# Altium footprint library CRD25DA12N-FMC.PcbLib: 142 footprints (part 9 of 9)
Each footprint in its own frame and in the unit in brackets; x right, y up, seen from the top. Pads: shape width x height; smd on the part's side, far side on the other; paste and mask are expansions set on the pad; w line width, h text height; cw(c..) or ccw(c..) is an arc to the next point about the centre after c.
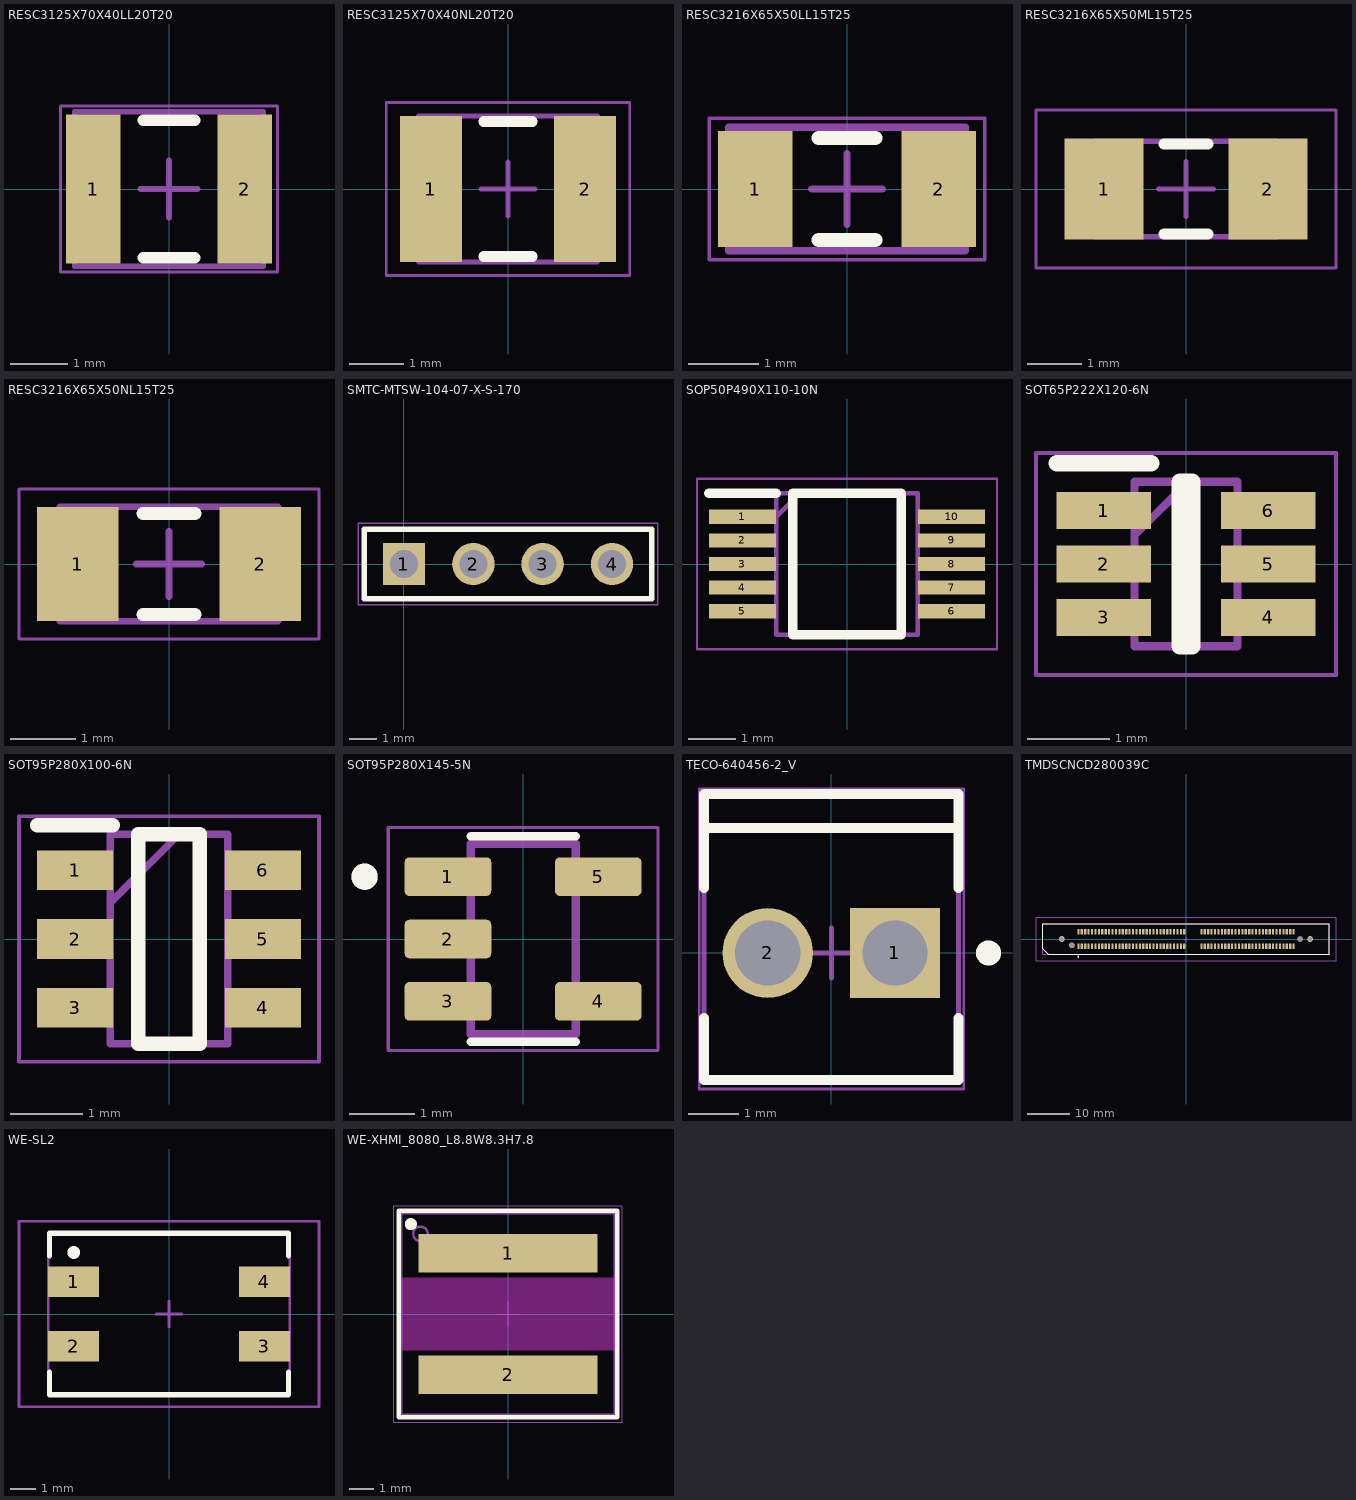
[diagram p8: the footprints below, top view; thin cyan lines are the x and y axes]

## RESC3125X70X40LL20T20 [mm] "Chip Resistor, 2-Leads, Body 3.10x2.50mm, IPC High Density"
height 0.7
pads (2):
  rect 0.95x2.6 smd: 1(-1.325,0) 2(1.325,0)
Top Overlay:
  lines w0.2: -0.45,-1.2 0.45,-1.2 ; -0.45,1.2 0.45,1.2
Mechanical 13:
  lines w0.1: -1.65,-1.35 1.65,-1.35 1.65,1.35 -1.65,1.35 -1.65,-1.35
Mechanical 15:
  lines w0.05: -1.9,-1.45 1.9,-1.45 1.9,1.45 -1.9,1.45 -1.9,-1.45
  lines w0.1: -0.5,0 0.5,0 ; 0,-0.5 0,0.5
3D body: height 0.7, standoff 0, extent 1.25,-1.35 1.65,1.35
3D body: height 0.7, standoff 0, extent -1.65,-1.35 -1.25,1.35
3D body: height 0.7, standoff 0, extent -1.25,-1.35 1.25,1.35

## RESC3125X70X40NL20T20 [mm] "Chip Resistor, 2-Leads, Body 3.10x2.50mm, IPC Medium Density"
height 0.7
pads (2):
  rect 1.15x2.7 smd: 1(-1.425,0) 2(1.425,0)
Top Overlay:
  lines w0.2: -0.45,-1.25 0.45,-1.25 ; -0.45,1.25 0.45,1.25
Mechanical 13:
  lines w0.1: -1.65,-1.35 -1.65,1.35 1.65,1.35 1.65,-1.35 -1.65,-1.35
Mechanical 15:
  lines w0.05: -2.25,-1.6 -2.25,1.6 2.25,1.6 2.25,-1.6 -2.25,-1.6
  lines w0.1: -0.5,0 0.5,0 ; 0,-0.5 0,0.5
3D body: height 0.7, standoff 0, extent -1.25,-1.35 1.25,1.35
3D body: height 0.7, standoff 0, extent -1.65,-1.35 -1.25,1.35
3D body: height 0.7, standoff 0, extent 1.25,-1.35 1.65,1.35

## RESC3216X65X50LL15T25 [mm] "Chip Resistor, 2-Leads, Body 3.20x1.60mm, IPC High Density"
height 0.65
pads (2):
  rect 1.05x1.65 smd: 1(-1.3,0) 2(1.3,0)
Top Overlay:
  lines w0.2: -0.4,-0.725 0.4,-0.725 ; -0.4,0.725 0.4,0.725
Mechanical 13:
  lines w0.1: -1.675,-0.875 -1.675,0.875 1.675,0.875 1.675,-0.875 -1.675,-0.875
Mechanical 15:
  lines w0.05: -1.95,-1 -1.95,1 1.95,1 1.95,-1 -1.95,-1
  lines w0.1: -0.5,0 0.5,0 ; 0,-0.5 0,0.5
3D body: height 0.65, standoff 0, extent -1.175,-0.875 1.175,0.875
3D body: height 0.65, standoff 0, extent -1.675,-0.875 -1.175,0.875
3D body: height 0.65, standoff 0, extent 1.175,-0.875 1.675,0.875

## RESC3216X65X50ML15T25 [mm] "Chip Resistor, 2-Leads, Body 3.20x1.60mm, IPC Low Density"
height 0.65
pads (2):
  rect 1.45x1.85 smd: 1(-1.5,0) 2(1.5,0)
Top Overlay:
  lines w0.2: -0.4,-0.825 0.4,-0.825 ; -0.4,0.825 0.4,0.825
Mechanical 13:
  lines w0.1: -1.675,-0.875 -1.675,0.875 1.675,0.875 1.675,-0.875 -1.675,-0.875
Mechanical 15:
  lines w0.05: -2.75,-1.45 -2.75,1.45 2.75,1.45 2.75,-1.45 -2.75,-1.45
  lines w0.1: -0.5,0 0.5,0 ; 0,-0.5 0,0.5
3D body: height 0.65, standoff 0, extent -1.175,-0.875 1.175,0.875
3D body: height 0.65, standoff 0, extent -1.675,-0.875 -1.175,0.875
3D body: height 0.65, standoff 0, extent 1.175,-0.875 1.675,0.875

## RESC3216X65X50NL15T25 [mm] "Chip Resistor, 2-Leads, Body 3.20x1.60mm, IPC Medium Density"
height 0.65
pads (2):
  rect 1.25x1.75 smd: 1(-1.4,0) 2(1.4,0)
Top Overlay:
  lines w0.2: -0.4,-0.775 0.4,-0.775 ; -0.4,0.775 0.4,0.775
Mechanical 13:
  lines w0.1: -1.675,-0.875 1.675,-0.875 1.675,0.875 -1.675,0.875 -1.675,-0.875
Mechanical 15:
  lines w0.05: -2.3,-1.15 2.3,-1.15 2.3,1.15 -2.3,1.15 -2.3,-1.15
  lines w0.1: -0.5,0 0.5,0 ; 0,-0.5 0,0.5
3D body: height 0.65, standoff 0, extent 1.175,-0.875 1.675,0.875
3D body: height 0.65, standoff 0, extent -1.675,-0.875 -1.175,0.875
3D body: height 0.65, standoff 0, extent -1.175,-0.875 1.175,0.875

## SMTC-MTSW-104-07-X-S-170 [mm] "Assembly .025\" [.64] SQ Post Terminal Strip, 1x4 Pins, Vertical, 2.54mm Pitch, Male"
height 7.061
pads (4):
  rect 1.55x1.55 hole 1.02: 1(0,0)
  round 1.55 hole 1.02: 2(2.54,0) 3(5.08,0) 4(7.62,0)
Top Overlay:
  lines w0.2: -1.46,-1.27 -1.46,1.27 9.08,1.27 9.08,-1.27 -1.46,-1.27
Mechanical 13:
  lines w0.1: -1.46,-1.27 -1.46,1.27 9.08,1.27 9.08,-1.27 -1.46,-1.27
Mechanical 15:
  lines w0.05: -1.685,-1.495 -1.685,1.495 9.305,1.495 9.305,-1.495 -1.685,-1.495
3D body "MTSW-104-07-X-S-170.step": height 6.86, standoff -4.06, extent -1.27,-1.27 8.89,1.27

## SOP50P490X110-10N [mm]
pads (10):
  rect 1.425x0.3 smd: 1(-2.212,1) 2(-2.212,0.5) 3(-2.212,0) 4(-2.212,-0.5) 5(-2.212,-1) 6(2.212,-1) 7(2.212,-0.5) 8(2.212,0) 9(2.212,0.5) 10(2.212,1)
Top Overlay:
  lines w0.2: -2.925,1.5 -1.5,1.5 ; -1.15,-1.5 1.15,-1.5 1.15,1.5 -1.15,1.5 -1.15,-1.5
Top Designator:
  text ".Designator" at -7.618,-0.508 h1.52
Mechanical 13:
  lines w0.1: -1.5,1 -1,1.5 ; -1.5,-1.5 1.5,-1.5 1.5,1.5 -1.5,1.5 -1.5,-1.5
Mechanical 15:
  lines w0.05: -3.175,-1.801 3.175,-1.801 3.175,1.801 -3.175,1.801 -3.175,-1.801
3D body "LTC4368IMS-2#PBF.stp": height 1.1, standoff 0, extent -2.45,-1.5 2.45,1.5

## SOT65P222X120-6N [mm]
pads (6):
  rect 1.15x0.45 smd: 1(-1,0.65) 2(-1,0) 3(-1,-0.65) 4(1,-0.65) 5(1,0) 6(1,0.65)
Top Overlay:
  lines w0.2: -1.575,1.225 -0.425,1.225 ; -0.075,-1 0.075,-1 0.075,1 -0.075,1 -0.075,-1
Top Designator:
  text ".Designator" at -7.618,-0.508 h1.52
Mechanical 13:
  lines w0.1: -0.625,0.35 0.025,1 ; -0.625,-1 0.625,-1 0.625,1 -0.625,1 -0.625,-1
Mechanical 15:
  lines w0.05: -1.825,-1.35 1.825,-1.35 1.825,1.35 -1.825,1.35 -1.825,-1.35
3D body "BAS40DW-04-TP.stp": height 1.2, standoff 0, extent -1.112,-1 1.112,1

## SOT95P280X100-6N [mm]
pads (6):
  rect 1.05x0.55 smd: 1(-1.3,0.95) 2(-1.3,0) 3(-1.3,-0.95) 4(1.3,-0.95) 5(1.3,0) 6(1.3,0.95)
Top Overlay:
  lines w0.2: -1.825,1.575 -0.775,1.575 ; -0.425,-1.45 -0.425,1.45 0.425,1.45 0.425,-1.45 -0.425,-1.45
Mechanical 13:
  lines w0.1: -0.812,0.5 0.138,1.45 ; -0.812,-1.45 -0.812,1.45 0.812,1.45 0.812,-1.45 -0.812,-1.45
Mechanical 15:
  lines w0.05: -2.075,-1.7 -2.075,1.7 2.075,1.7 2.075,-1.7 -2.075,-1.7
3D body "LTC6992CS6-2#TRMPBF.stp": height 1, standoff 0, extent -1.4,-1.45 1.4,1.45

## SOT95P280X145-5N [mm]
pads (5):
  rrect25% 1.32x0.59 smd: 1(-1.145,0.95) 2(-1.145,0) 3(-1.145,-0.95) 4(1.145,-0.95) 5(1.145,0.95)
Top Overlay:
  circle w0.2: c-2.415,0.95 r0.1
  lines w0.127: -0.8,-1.565 0.8,-1.565 ; -0.8,1.565 0.8,1.565
Mechanical 13:
  circle w0.2: c-2.415,0.95 r0.1
  lines w0.127: -0.8,-1.45 0.8,-1.45 0.8,1.45 -0.8,1.45 -0.8,-1.45
Mechanical 15:
  lines w0.05: -2.055,-1.7 2.055,-1.7 2.055,1.7 -2.055,1.7 -2.055,-1.7
3D body "SOT-23-5.step": height 1.11, standoff 0.01, extent -1.25,-1.5 1.25,1.5

## TECO-640456-2_V [mm] "HDR, 2-Leads, Body 5.715x5.08mm, Pitch 2.54mm"
height 10.49
pads (2):
  rect 1.8x1.8 hole 1.3: 1(1.27,0)
  round 1.8 hole 1.3: 2(-1.27,0)
Top Overlay:
  circle w0.25: c3.14,0 r0.125
  lines w0.2: -2.54,-1.3 -2.54,-2.54 2.54,-2.54 2.54,-1.3 ; -2.54,1.3 -2.54,3.175 2.54,3.175 2.54,1.3 ; -2.54,2.5 2.54,2.5
Mechanical 13:
  lines w0.1: -2.54,-2.54 -2.54,3.175 2.54,3.175 2.54,-2.54 -2.54,-2.54
Mechanical 15:
  lines w0.05: -2.64,-2.717 2.64,-2.717 2.64,3.275 -2.64,3.275 -2.64,-2.717
  lines w0.1: -0.5,0 0.5,0 ; 0,-0.5 0,0.5
3D body "TE 640456-2 Color.STEP": height 10.09, standoff -3.5, extent -2.54,-2.667 2.54,3.175

## TMDSCNCD280039C [mm]
pads (124):
  rect 0.5x1.2 smd paste+0 mask+0: 1(25.2,1.7) 2(25.2,-1.7) 3(24.4,1.7) 4(24.4,-1.7) 5(23.6,1.7) 6(23.6,-1.7) 7(22.8,1.7) 8(22.8,-1.7) 9(22,1.7) 10(22,-1.7) 11(21.2,1.7) 12(21.2,-1.7) 13(20.4,1.7) 14(20.4,-1.7) 15(19.6,1.7) 16(19.6,-1.7) 17(18.8,1.7) 18(18.8,-1.7) 19(18,1.7) 20(18,-1.7) 21(17.2,1.7) 22(17.2,-1.7) 23(16.4,1.7) 24(16.4,-1.7) 25(15.6,1.7) 26(15.6,-1.7) 27(14.8,1.7) 28(14.8,-1.7) 29(14,1.7) 30(14,-1.7) 31(13.2,1.7) 32(13.2,-1.7) 33(12.4,1.7) 34(12.4,-1.7) 35(11.6,1.7) 36(11.6,-1.7) 37(10.8,1.7) 38(10.8,-1.7) 39(10,1.7) 40(10,-1.7) 41(9.2,1.7) 42(9.2,-1.7) 43(8.4,1.7) 44(8.4,-1.7) 45(7.6,1.7) 46(7.6,-1.7) 47(6.8,1.7) 48(6.8,-1.7) 49(6,1.7) 50(6,-1.7) 51(5.2,1.7) 52(5.2,-1.7) 53(4.4,1.7) 54(4.4,-1.7) 55(3.6,1.7) 56(3.6,-1.7) 57(-0.4,1.7) 58(-0.4,-1.7) 59(-1.2,1.7) 60(-1.2,-1.7) 61(-2,1.7) 62(-2,-1.7) 63(-2.8,1.7) 64(-2.8,-1.7) 65(-3.6,1.7) 66(-3.6,-1.7) 67(-4.4,1.7) 68(-4.4,-1.7) 69(-5.2,1.7) 70(-5.2,-1.7) 71(-6,1.7) 72(-6,-1.7) 73(-6.8,1.7) 74(-6.8,-1.7) 75(-7.6,1.7) 76(-7.6,-1.7) 77(-8.4,1.7) 78(-8.4,-1.7) 79(-9.2,1.7) 80(-9.2,-1.7) 81(-10,1.7) 82(-10,-1.7) 83(-10.8,1.7) 84(-10.8,-1.7) 85(-11.6,1.7) 86(-11.6,-1.7) 87(-12.4,1.7) 88(-12.4,-1.7) 89(-13.2,1.7) 90(-13.2,-1.7) 91(-14,1.7) 92(-14,-1.7) 93(-14.8,1.7) 94(-14.8,-1.7) 95(-15.6,1.7) 96(-15.6,-1.7) 97(-16.4,1.7) 98(-16.4,-1.7) 99(-17.2,1.7) 100(-17.2,-1.7) 101(-18,1.7) 102(-18,-1.7) 103(-18.8,1.7) 104(-18.8,-1.7) 105(-19.6,1.7) 106(-19.6,-1.7) 107(-20.4,1.7) 108(-20.4,-1.7) 109(-21.2,1.7) 110(-21.2,-1.7) 111(-22,1.7) 112(-22,-1.7) 113(-22.8,1.7) 114(-22.8,-1.7) 115(-23.6,1.7) 116(-23.6,-1.7) 117(-24.4,1.7) 118(-24.4,-1.7) 119(-25.2,1.7) 120(-25.2,-1.7)
  round 1.34 hole 0.84 paste-2539.97 mask+0: 121(-29.05,0) 122(29.05,0)
  round 1.27 hole 1.27 unplated paste-2539.97 mask+0: ""(-26.7,-1.5) ""(26.7,0)
Top Overlay:
  circle w0.25: c-25.2,-4.125 r0.125
  lines w0.2: -33.55,-2.295 -33.55,3.565 33.55,3.565 33.55,-3.565 -32.28,-3.565 -33.55,-2.295
Top Paste:
  circle w1.27: c-29.05,0 r0.635
  circle w1.27: c29.05,0 r0.635
Mechanical 5:
  lines w0.2: -35.115,-5.09 35.115,-5.09 35.115,5.09 -35.115,5.09 -35.115,-5.09
  text ".Designator" at 0,0.188 h1
Mechanical 13:
  lines w0.2: -33.55,-3.565 33.55,-3.565 33.55,3.565 -33.55,3.565 -33.55,-3.565
Mechanical 15:
  lines w0.2: -35.115,-5.09 35.115,-5.09 35.115,5.09 -35.115,5.09 -35.115,-5.09
Mechanical 16:
  lines w0.1: -0.5,0 0.5,0 ; 0,-0.5 0,0.5
3D body "TI TMS320F280039C.step": height 57.35, standoff 2, extent -33.874,-4.89 34.671,5.68
3D body "Samtec HSEC8-160-01-L-DV-A-BL.stp": height 12.4, standoff -1.3, extent -33.525,-3.5 33.525,3.5

## WE-SL2 [mm] "SMD Inductor, 4-Leads, Body 6.3 x 9.5 mm"
height 5.3
pads (4):
  rect 2x1.2 smd: 1(-3.75,1.27) 2(-3.75,-1.27) 3(3.75,-1.27) 4(3.75,1.27)
Top Overlay:
  circle w0.25: c-3.75,2.42 r0.125
  lines w0.2: -4.699,-2.286 -4.699,-3.175 ; -4.699,2.286 -4.699,3.175 4.699,3.175 4.699,2.286 ; 4.699,-2.286 4.699,-3.175 ; -4.699,-3.175 4.699,-3.175 ; -4.699,-3.175 4.699,-3.175 ; -4.699,-3.175 4.699,-3.175
Mechanical 13:
  lines w0.1: -4.75,-3.15 4.75,-3.15 4.75,3.15 -4.75,3.15 -4.75,-3.15
Mechanical 15:
  lines w0.1: -0.5,0 0.5,0 ; 0,-0.5 0,0.5 ; -5.9,-3.65 5.9,-3.65 5.9,3.65 -5.9,3.65 -5.9,-3.65
3D body "744229.stp": height 5, standoff 0, extent -4.6,-3 4.6,3

## WE-XHMI_8080_L8.8W8.3H7.8 [mm] "SMT Power Inductor, 2-Leads, body 8.8x8.3mm"
height 7.8
pads (2):
  rect 7.35x1.6 smd: 1(0,2.5) 2(0,-2.5)
Top Layer keep-out:
  region: -4.4,1.5 4.4,1.5 4.4,-1.5 -4.4,-1.5
Top Overlay:
  circle w0.25: c-4,3.7 r0.125
  lines w0.2: -4.5,-4.25 -4.5,4.25 4.5,4.25 4.5,-4.25 -4.5,-4.25
Top 3D Body:
  circle w0.1: c-3.6,3.3 r0.3
  lines w0.1: -4.4,-4.15 4.4,-4.15 4.4,4.15 -4.4,4.15 -4.4,-4.15
Top Courtyard:
  lines w0.05: -0.5,0 0.5,0 ; 0,-0.5 0,0.5 ; -4.7,-4.45 -4.7,4.45 4.7,4.45 4.7,-4.45 -4.7,-4.45
Top Component Outline:
  circle w0.1: c-3.6,3.3 r0.3
  lines w0.1: -4.4,-4.15 -4.4,4.15 4.4,4.15 4.4,-4.15 -4.4,-4.15
Top Designator:
  text ".Designator" at -7.498,-0.5 h1.5
3D body "74439358xxx.stp": height 7.8, standoff 0, extent -4.4,-4.15 4.4,4.15